# Altium footprint library MainLibrary.PcbLib: 85 footprints (part 4 of 6)
Each footprint in its own frame and in the unit in brackets; x right, y up, seen from the top. Pads: shape width x height; smd on the part's side, far side on the other; paste and mask are expansions set on the pad; w line width, h text height; cw(c..) or ccw(c..) is an arc to the next point about the centre after c.
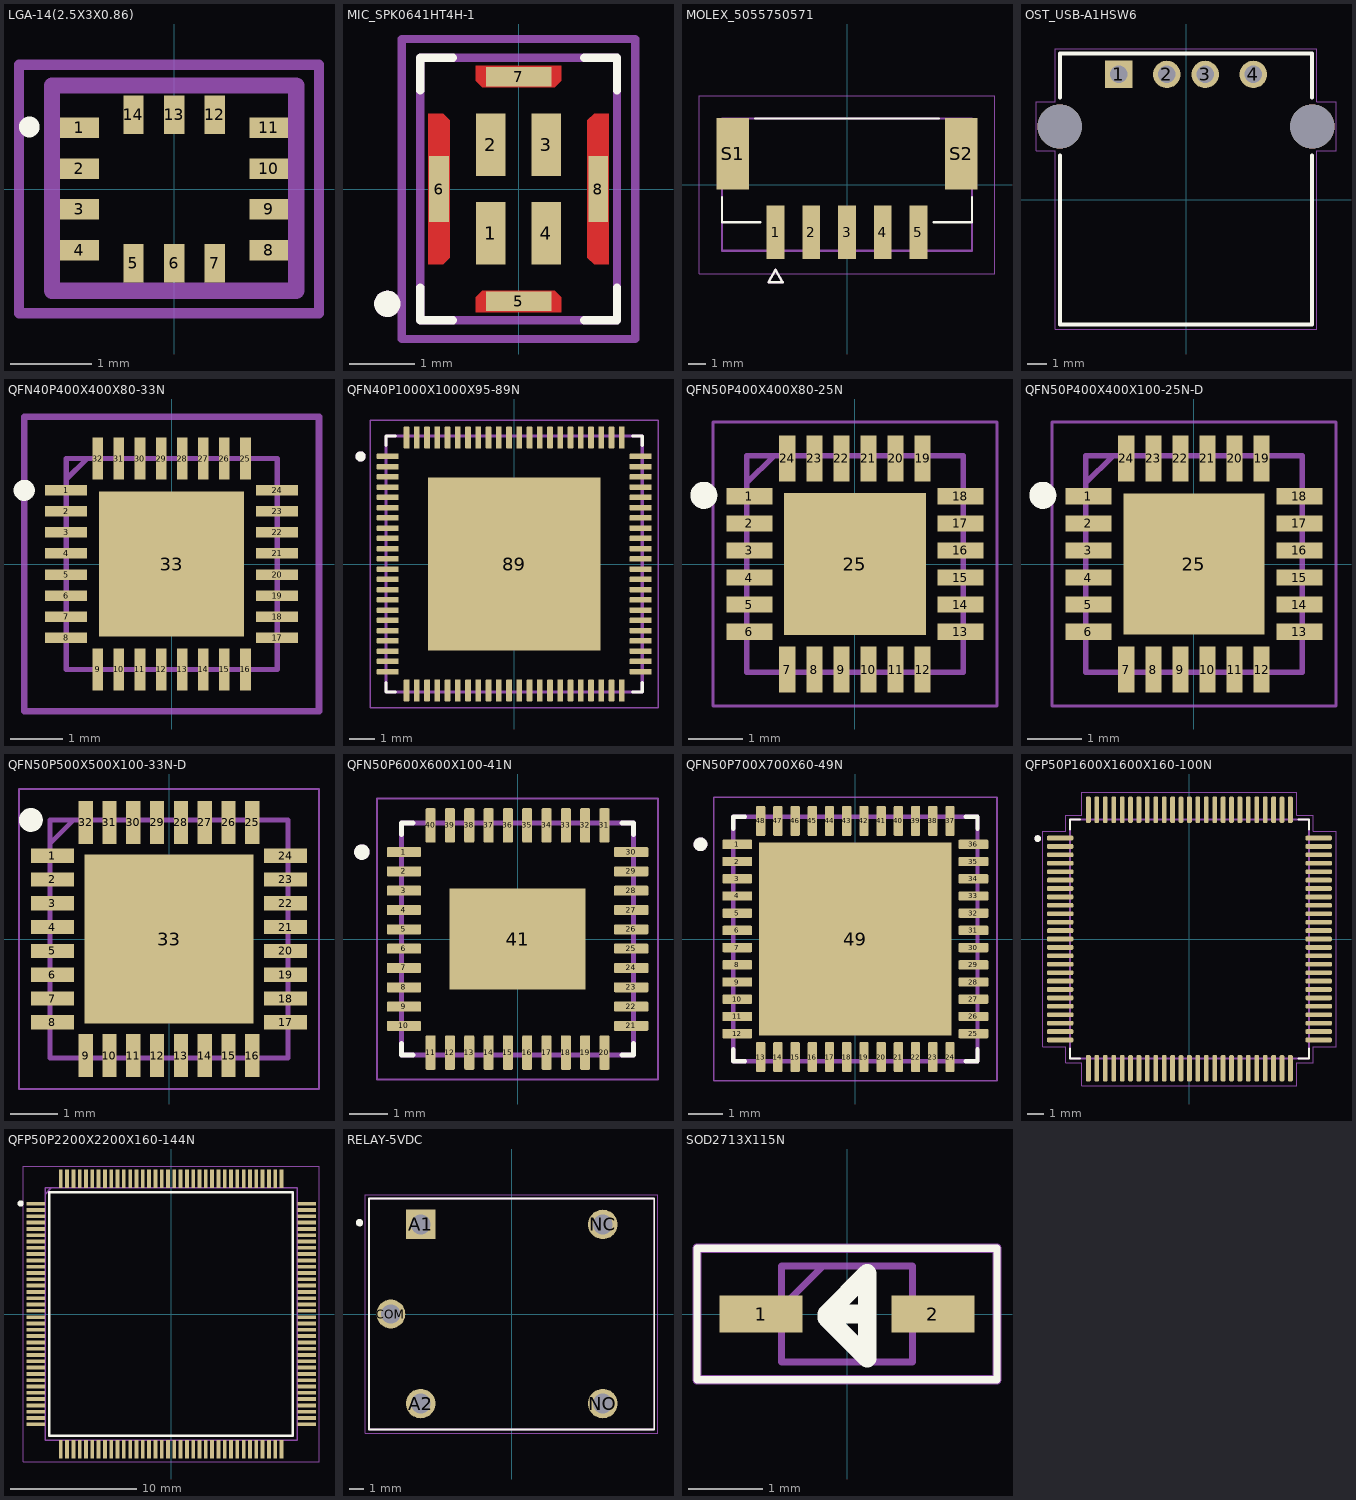
[diagram p3: the footprints below, top view; thin cyan lines are the x and y axes]

## LGA-14(2.5X3X0.86) [mm]
pads (14):
  rect 0.475x0.25 smd: 1(-1.162,0.75) 2(-1.162,0.25) 3(-1.162,-0.25) 4(-1.162,-0.75) 8(1.162,-0.75) 9(1.162,-0.25) 10(1.162,0.25) 11(1.162,0.75)
  rect 0.25x0.475 smd: 5(-0.5,-0.913) 6(0,-0.913) 7(0.5,-0.913) 12(0.5,0.913) 13(0,0.913) 14(-0.5,0.913)
Top Overlay:
  circle w0.2: c-1.778,0.762 r0.027
Mechanical 13:
  lines w0.2: -1.5,-1.25 -1.5,1.27 1.5,1.27 1.5,-1.25 -1.5,-1.25
Mechanical 15:
  lines w0.127: -1.905,-1.524 1.778,-1.524 1.778,1.524 -1.905,1.524 -1.905,-1.524
3D body "LSM6DSOTR.stp": height 0.86, standoff 0, extent -1.5,-1.25 1.5,1.25

## MIC_SPK0641HT4H-1 [mm]
height 1.1
pads (8):
  rect 0.45x0.95 smd mask+0.05: 1(-0.425,-0.675) 2(-0.425,0.675) 3(0.425,0.675) 4(0.425,-0.675)
  rect 1x0.3 smd paste-1 mask+0: 5(0,-1.713) 7(0,1.713)
  rect 0.3x1 smd paste-1 mask+0: 6(-1.212,0) 8(1.212,0)
Top Layer:
  region: -1.05,1.05 -1.05,-1.05 -1.15,-1.15 -1.375,-1.15 -1.375,1.15 -1.15,1.15
  region: 1.375,-1.15 1.15,-1.15 1.05,-1.05 1.05,1.05 1.15,1.15 1.375,1.15
  region: 0.65,1.65 0.55,1.55 -0.55,1.55 -0.65,1.65 -0.65,1.875 0.65,1.875
  region: 0.65,-1.65 0.65,-1.875 -0.65,-1.875 -0.65,-1.65 -0.55,-1.55 0.55,-1.55
Top Overlay:
  circle w0.2: c-2,-1.75 r0.1
  lines w0.127: -1.5,-1.5 -1.5,-2 -1,-2 ; -1.5,1.5 -1.5,2 -1,2 ; 1,-2 1.5,-2 1.5,-1.5 ; 1,2 1.5,2 1.5,1.5
Top Paste:
  region: -1.05,1.05 -1.05,-1.05 -1.15,-1.15 -1.375,-1.15 -1.375,1.15 -1.15,1.15
  region: 1.375,-1.15 1.15,-1.15 1.05,-1.05 1.05,1.05 1.15,1.15 1.375,1.15
  region: 0.65,1.65 0.55,1.55 -0.55,1.55 -0.65,1.65 -0.65,1.875 0.65,1.875
  region: 0.65,-1.65 0.65,-1.875 -0.65,-1.875 -0.65,-1.65 -0.55,-1.55 0.55,-1.55
Top Solder:
  region: -0.95,1.1 -0.95,-1.1 -1.1,-1.25 -1.475,-1.25 -1.475,1.25 -1.1,1.25
  region: 1.475,-1.25 1.1,-1.25 0.95,-1.1 0.95,1.1 1.1,1.25 1.475,1.25
  region: 0.75,1.6 0.6,1.45 -0.6,1.45 -0.75,1.6 -0.75,1.975 0.75,1.975
  region: 0.75,-1.6 0.75,-1.975 -0.75,-1.975 -0.75,-1.6 -0.6,-1.45 0.6,-1.45
Mechanical 13:
  circle w0.2: c-2,-1.75 r0.1
  lines w0.127: -1.5,-2 1.5,-2 1.5,2 -1.5,2 -1.5,-2
Mechanical 15:
  lines w0.127: -1.778,-2.286 1.778,-2.286 1.778,2.286 -1.778,2.286 -1.778,-2.286

## MOLEX_5055750571 [mm]
height 8.6
pads (7):
  rect 1x3 smd mask+0.076: 1(-4,-2.655) 2(-2,-2.655) 3(0,-2.655) 4(2,-2.655) 5(4,-2.655)
  rect 1.8x4 smd mask+0.076: S1(-6.4,1.745) S2(6.4,1.745)
Top Overlay:
  lines w0.127: -7,-0.695 -7,-2.095 -4.85,-2.095 ; -5.15,3.705 5.15,3.705 ; 4.85,-2.095 7,-2.095 7,-0.695 ; -4.4,-5.455 -4,-4.755 -3.6,-5.455 -4.4,-5.455
Mechanical 13:
  lines w0.127: -7,-3.705 -7,3.705 7,3.705 7,-3.705 -7,-3.705 ; -4.4,-5.455 -4,-4.755 -3.6,-5.455 -4.4,-5.455
Mechanical 15:
  lines w0.05: -8.27,-4.975 8.27,-4.975 8.27,4.975 -8.27,4.975 -8.27,-4.975
3D body "5055750571.stp": height 8.6, standoff 0, extent -7,-3.727 7,3.683

## OST_USB-A1HSW6 [mm]
pads (6):
  rect 1.428x1.428 / inner round 1.428 / far side rect 1.428x1.428 hole 0.92: 1(-3.5,6.51)
  round 1.428 hole 0.92: 2(-1,6.51) 3(1,6.51) 4(3.5,6.51)
  round 2.3 hole 2.3 unplated: ""(-6.57,3.8) ""(6.57,3.8)
Top Overlay:
  lines w0.2: -6.55,2.3 -6.55,-6.5 6.55,-6.5 6.55,2.3 ; -6.55,5.3 -6.55,7.6 6.55,7.6 6.55,5.3
Mechanical 15:
  lines w0.05: -7.8,2.55 -7.8,5.1 -6.8,5.1 -6.8,7.85 6.8,7.85 6.8,5.1 7.8,5.1 7.8,2.55 6.8,2.55 6.8,-6.75 -6.8,-6.75 -6.8,2.55 -7.8,2.55
3D body "step_temp.STEP": height 7.16, standoff -3.64, extent -7.9,-6.48 7.9,7.62

## PCBComponent_1 [mm]

## QFN40P400X400X80-33N [mm]
pads (33):
  rect 0.8x0.2 smd: 1(-2,1.4) 2(-2,1) 3(-2,0.6) 4(-2,0.2) 5(-2,-0.2) 6(-2,-0.6) 7(-2,-1) 8(-2,-1.4) 17(2,-1.4) 18(2,-1) 19(2,-0.6) 20(2,-0.2) 21(2,0.2) 22(2,0.6) 23(2,1) 24(2,1.4)
  rect 0.2x0.8 smd: 9(-1.4,-2) 10(-1,-2) 11(-0.6,-2) 12(-0.2,-2) 13(0.2,-2) 14(0.6,-2) 15(1,-2) 16(1.4,-2) 25(1.4,2) 26(1,2) 27(0.6,2) 28(0.2,2) 29(-0.2,2) 30(-0.6,2) 31(-1,2) 32(-1.4,2)
  rect 2.75x2.75 smd: 33(0,0)
Top Overlay:
  circle w0.2: c-2.794,1.397 r0.1
Mechanical 13:
  lines w0.1: -2,1.6 -1.6,2 ; -2,-2 2,-2 2,2 -2,2 -2,-2
Mechanical 15:
  lines w0.127: -2.794,-2.794 2.794,-2.794 2.794,2.794 -2.794,2.794 -2.794,-2.794
3D body "WM8904CGEFL_V.stp": height 0.8, standoff 0, extent -2.05,-2.05 2.05,2.05

## QFN40P1000X1000X95-89N [mm]
pads (89):
  rrect25% 0.86x0.22 smd: 1(-4.935,4.2) 2(-4.935,3.8) 3(-4.935,3.4) 4(-4.935,3) 5(-4.935,2.6) 6(-4.935,2.2) 7(-4.935,1.8) 8(-4.935,1.4) 9(-4.935,1) 10(-4.935,0.6) 11(-4.935,0.2) 12(-4.935,-0.2) 13(-4.935,-0.6) 14(-4.935,-1) 15(-4.935,-1.4) 16(-4.935,-1.8) 17(-4.935,-2.2) 18(-4.935,-2.6) 19(-4.935,-3) 20(-4.935,-3.4) 21(-4.935,-3.8) 22(-4.935,-4.2) 45(4.935,-4.2) 46(4.935,-3.8) 47(4.935,-3.4) 48(4.935,-3) 49(4.935,-2.6) 50(4.935,-2.2) 51(4.935,-1.8) 52(4.935,-1.4) 53(4.935,-1) 54(4.935,-0.6) 55(4.935,-0.2) 56(4.935,0.2) 57(4.935,0.6) 58(4.935,1) 59(4.935,1.4) 60(4.935,1.8) 61(4.935,2.2) 62(4.935,2.6) 63(4.935,3) 64(4.935,3.4) 65(4.935,3.8) 66(4.935,4.2)
  rrect25% 0.22x0.86 smd: 23(-4.2,-4.935) 24(-3.8,-4.935) 25(-3.4,-4.935) 26(-3,-4.935) 27(-2.6,-4.935) 28(-2.2,-4.935) 29(-1.8,-4.935) 30(-1.4,-4.935) 31(-1,-4.935) 32(-0.6,-4.935) 33(-0.2,-4.935) 34(0.2,-4.935) 35(0.6,-4.935) 36(1,-4.935) 37(1.4,-4.935) 38(1.8,-4.935) 39(2.2,-4.935) 40(2.6,-4.935) 41(3,-4.935) 42(3.4,-4.935) 43(3.8,-4.935) 44(4.2,-4.935) 67(4.2,4.935) 68(3.8,4.935) 69(3.4,4.935) 70(3,4.935) 71(2.6,4.935) 72(2.2,4.935) 73(1.8,4.935) 74(1.4,4.935) 75(1,4.935) 76(0.6,4.935) 77(0.2,4.935) 78(-0.2,4.935) 79(-0.6,4.935) 80(-1,4.935) 81(-1.4,4.935) 82(-1.8,4.935) 83(-2.2,4.935) 84(-2.6,4.935) 85(-3,4.935) 86(-3.4,4.935) 87(-3.8,4.935) 88(-4.2,4.935)
  rect 6.74x6.74 smd paste-2.66: 89(0,0)
Top Overlay:
  circle w0.2: c-5.995,4.2 r0.1
  lines w0.127: -5,-4.63 -5,-5 -4.63,-5 ; -5,4.63 -5,5 -4.63,5 ; 4.63,-5 5,-5 5,-4.63 ; 4.63,5 5,5 5,4.63
Top Paste:
  region: -1.54,1.54 -2.96,1.54 -2.96,2.96 -1.54,2.96
  region: 0.71,1.54 -0.71,1.54 -0.71,2.96 0.71,2.96
  region: 2.96,1.54 1.54,1.54 1.54,2.96 2.96,2.96
  region: -1.54,-0.71 -2.96,-0.71 -2.96,0.71 -1.54,0.71
  region: 2.96,-0.71 1.54,-0.71 1.54,0.71 2.96,0.71
  region: -1.54,-2.96 -2.96,-2.96 -2.96,-1.54 -1.54,-1.54
  region: 0.71,-2.96 -0.71,-2.96 -0.71,-1.54 0.71,-1.54
  region: 2.96,-2.96 1.54,-2.96 1.54,-1.54 2.96,-1.54
Mechanical 13:
  circle w0.2: c-5.995,4.2 r0.1
  lines w0.127: -5,-5 5,-5 5,5 -5,5 -5,-5
Mechanical 15:
  lines w0.05: -5.615,-5.615 5.615,-5.615 5.615,5.615 -5.615,5.615 -5.615,-5.615
3D body "--3DModel-STEP-56544.STEP": height 0.9, standoff 0, extent -5,-5 5,5

## QFN50P400X400X80-25N [mm]
pads (25):
  rect 0.85x0.3 smd: 1(-1.95,1.25) 2(-1.95,0.75) 3(-1.95,0.25) 4(-1.95,-0.25) 5(-1.95,-0.75) 6(-1.95,-1.25) 13(1.95,-1.25) 14(1.95,-0.75) 15(1.95,-0.25) 16(1.95,0.25) 17(1.95,0.75) 18(1.95,1.25)
  rect 0.3x0.85 smd: 7(-1.25,-1.95) 8(-0.75,-1.95) 9(-0.25,-1.95) 10(0.25,-1.95) 11(0.75,-1.95) 12(1.25,-1.95) 19(1.25,1.95) 20(0.75,1.95) 21(0.25,1.95) 22(-0.25,1.95) 23(-0.75,1.95) 24(-1.25,1.95)
  rect 2.63x2.63 smd: 25(0,0)
Top Overlay:
  circle w0.25: c-2.794,1.27 r0.125
Mechanical 13:
  lines w0.1: -2,1.5 -1.5,2 ; -2,-2 2,-2 2,2 -2,2 -2,-2
Mechanical 15:
  lines w0.05: -2.625,-2.625 2.625,-2.625 2.625,2.625 -2.625,2.625 -2.625,-2.625
3D body "MAX9860ETG+T.stp": height 0.8, standoff 0, extent -2.05,-2.05 2.05,2.05

## QFN50P400X400X100-25N-D [mm]
pads (25):
  rect 0.85x0.3 smd: 1(-1.95,1.25) 2(-1.95,0.75) 3(-1.95,0.25) 4(-1.95,-0.25) 5(-1.95,-0.75) 6(-1.95,-1.25) 13(1.95,-1.25) 14(1.95,-0.75) 15(1.95,-0.25) 16(1.95,0.25) 17(1.95,0.75) 18(1.95,1.25)
  rect 0.3x0.85 smd: 7(-1.25,-1.95) 8(-0.75,-1.95) 9(-0.25,-1.95) 10(0.25,-1.95) 11(0.75,-1.95) 12(1.25,-1.95) 19(1.25,1.95) 20(0.75,1.95) 21(0.25,1.95) 22(-0.25,1.95) 23(-0.75,1.95) 24(-1.25,1.95)
  rect 2.6x2.6 smd: 25(0,0)
Top Overlay:
  circle w0.25: c-2.794,1.27 r0.125
Mechanical 13:
  lines w0.1: -2,1.5 -1.5,2 ; -2,-2 -2,2 2,2 2,-2 -2,-2
Mechanical 15:
  lines w0.05: -2.625,-2.625 -2.625,2.625 2.625,2.625 2.625,-2.625 -2.625,-2.625
3D body "LAN8720A-CP-TR.stp": height 1, standoff 0, extent -2.05,-2.05 2.05,2.05

## QFN50P500X500X100-33N-D [mm]
pads (33):
  rect 0.9x0.3 smd: 1(-2.45,1.75) 2(-2.45,1.25) 3(-2.45,0.75) 4(-2.45,0.25) 5(-2.45,-0.25) 6(-2.45,-0.75) 7(-2.45,-1.25) 8(-2.45,-1.75) 17(2.45,-1.75) 18(2.45,-1.25) 19(2.45,-0.75) 20(2.45,-0.25) 21(2.45,0.25) 22(2.45,0.75) 23(2.45,1.25) 24(2.45,1.75)
  rect 0.3x0.9 smd: 9(-1.75,-2.45) 10(-1.25,-2.45) 11(-0.75,-2.45) 12(-0.25,-2.45) 13(0.25,-2.45) 14(0.75,-2.45) 15(1.25,-2.45) 16(1.75,-2.45) 25(1.75,2.45) 26(1.25,2.45) 27(0.75,2.45) 28(0.25,2.45) 29(-0.25,2.45) 30(-0.75,2.45) 31(-1.25,2.45) 32(-1.75,2.45)
  rect 3.55x3.55 smd: 33(0,0)
Top Overlay:
  circle w0.25: c-2.9,2.5 r0.125
Mechanical 13:
  lines w0.1: -2.5,2 -2,2.5 ; -2.5,-2.5 2.5,-2.5 2.5,2.5 -2.5,2.5 -2.5,-2.5
Mechanical 15:
  lines w0.05: -3.15,-3.15 3.15,-3.15 3.15,3.15 -3.15,3.15 -3.15,-3.15
3D body "TPS65263RHBR.STEP": height 1, standoff 0, extent -2.5,-2.5 2.5,2.5

## QFN50P600X600X100-41N [mm]
pads (41):
  rrect25% 0.89x0.26 smd: 1(-2.94,2.25) 2(-2.94,1.75) 3(-2.94,1.25) 4(-2.94,0.75) 5(-2.94,0.25) 6(-2.94,-0.25) 7(-2.94,-0.75) 8(-2.94,-1.25) 9(-2.94,-1.75) 10(-2.94,-2.25) 21(2.94,-2.25) 22(2.94,-1.75) 23(2.94,-1.25) 24(2.94,-0.75) 25(2.94,-0.25) 26(2.94,0.25) 27(2.94,0.75) 28(2.94,1.25) 29(2.94,1.75) 30(2.94,2.25)
  rrect25% 0.26x0.89 smd: 11(-2.25,-2.94) 12(-1.75,-2.94) 13(-1.25,-2.94) 14(-0.75,-2.94) 15(-0.25,-2.94) 16(0.25,-2.94) 17(0.75,-2.94) 18(1.25,-2.94) 19(1.75,-2.94) 20(2.25,-2.94) 31(2.25,2.94) 32(1.75,2.94) 33(1.25,2.94) 34(0.75,2.94) 35(0.25,2.94) 36(-0.25,2.94) 37(-0.75,2.94) 38(-1.25,2.94) 39(-1.75,2.94) 40(-2.25,2.94)
  rect 3.52x2.62 smd paste-3: 41(0,0)
Top Overlay:
  circle w0.2: c-4.03,2.25 r0.1
  lines w0.127: -3,-2.7 -3,-3 -2.7,-3 ; -3,2.7 -3,3 -2.7,3 ; 2.7,-3 3,-3 3,-2.7 ; 2.7,3 3,3 3,2.7
Top Paste:
  region: 1.11,-0.83 -1.11,-0.83 -1.11,0.83 1.11,0.83
Mechanical 13:
  circle w0.2: c-4.03,2.25 r0.1
  lines w0.127: -3,-3 3,-3 3,3 -3,3 -3,-3
Mechanical 15:
  lines w0.05: -3.635,-3.635 3.635,-3.635 3.635,3.635 -3.635,3.635 -3.635,-3.635
3D body "step_temp.STEP": height 1, standoff 0, extent -3,-3 3,3

## QFN50P700X700X60-49N [mm]
pads (49):
  rrect25% 0.87x0.27 smd: 1(-3.43,2.75) 2(-3.43,2.25) 3(-3.43,1.75) 4(-3.43,1.25) 5(-3.43,0.75) 6(-3.43,0.25) 7(-3.43,-0.25) 8(-3.43,-0.75) 9(-3.43,-1.25) 10(-3.43,-1.75) 11(-3.43,-2.25) 12(-3.43,-2.75) 25(3.43,-2.75) 26(3.43,-2.25) 27(3.43,-1.75) 28(3.43,-1.25) 29(3.43,-0.75) 30(3.43,-0.25) 31(3.43,0.25) 32(3.43,0.75) 33(3.43,1.25) 34(3.43,1.75) 35(3.43,2.25) 36(3.43,2.75)
  rrect25% 0.27x0.87 smd: 13(-2.75,-3.43) 14(-2.25,-3.43) 15(-1.75,-3.43) 16(-1.25,-3.43) 17(-0.75,-3.43) 18(-0.25,-3.43) 19(0.25,-3.43) 20(0.75,-3.43) 21(1.25,-3.43) 22(1.75,-3.43) 23(2.25,-3.43) 24(2.75,-3.43) 37(2.75,3.43) 38(2.25,3.43) 39(1.75,3.43) 40(1.25,3.43) 41(0.75,3.43) 42(0.25,3.43) 43(-0.25,3.43) 44(-0.75,3.43) 45(-1.25,3.43) 46(-1.75,3.43) 47(-2.25,3.43) 48(-2.75,3.43)
  rect 5.6x5.6 smd paste-4: 49(0,0)
Top Overlay:
  circle w0.2: c-4.5,2.75 r0.1
  lines w0.127: -3.55,-3.205 -3.55,-3.55 -3.205,-3.55 ; -3.55,3.205 -3.55,3.55 -3.205,3.55 ; 3.205,-3.55 3.55,-3.55 3.55,-3.205 ; 3.205,3.55 3.55,3.55 3.55,3.205
Top Paste:
  region: 2.29,-2.29 0.51,-2.29 0.51,-0.51 2.29,-0.51
  region: -0.51,-2.29 -2.29,-2.29 -2.29,-0.51 -0.51,-0.51
  region: 2.29,0.51 0.51,0.51 0.51,2.29 2.29,2.29
  region: -0.51,0.51 -2.29,0.51 -2.29,2.29 -0.51,2.29
Mechanical 13:
  circle w0.2: c-4.5,2.75 r0.1
  lines w0.127: -3.55,-3.55 -3.55,3.55 3.55,3.55 3.55,-3.55 -3.55,-3.55
Mechanical 15:
  lines w0.05: -4.115,-4.115 -4.115,4.115 4.115,4.115 4.115,-4.115 -4.115,-4.115
3D body "step_temp.STEP": height 0.6, standoff 0, extent -3.5,-3.5 3.5,3.5

## QFP50P1600X1600X160-100N [mm]
pads (100):
  rrect50% 1.56x0.28 smd: 1(-7.68,6) 2(-7.68,5.5) 3(-7.68,5) 4(-7.68,4.5) 5(-7.68,4) 6(-7.68,3.5) 7(-7.68,3) 8(-7.68,2.5) 9(-7.68,2) 10(-7.68,1.5) 11(-7.68,1) 12(-7.68,0.5) 13(-7.68,0) 14(-7.68,-0.5) 15(-7.68,-1) 16(-7.68,-1.5) 17(-7.68,-2) 18(-7.68,-2.5) 19(-7.68,-3) 20(-7.68,-3.5) 21(-7.68,-4) 22(-7.68,-4.5) 23(-7.68,-5) 24(-7.68,-5.5) 25(-7.68,-6) 51(7.68,-6) 52(7.68,-5.5) 53(7.68,-5) 54(7.68,-4.5) 55(7.68,-4) 56(7.68,-3.5) 57(7.68,-3) 58(7.68,-2.5) 59(7.68,-2) 60(7.68,-1.5) 61(7.68,-1) 62(7.68,-0.5) 63(7.68,0) 64(7.68,0.5) 65(7.68,1) 66(7.68,1.5) 67(7.68,2) 68(7.68,2.5) 69(7.68,3) 70(7.68,3.5) 71(7.68,4) 72(7.68,4.5) 73(7.68,5) 74(7.68,5.5) 75(7.68,6)
  rrect50% 0.28x1.56 smd: 26(-6,-7.68) 27(-5.5,-7.68) 28(-5,-7.68) 29(-4.5,-7.68) 30(-4,-7.68) 31(-3.5,-7.68) 32(-3,-7.68) 33(-2.5,-7.68) 34(-2,-7.68) 35(-1.5,-7.68) 36(-1,-7.68) 37(-0.5,-7.68) 38(0,-7.68) 39(0.5,-7.68) 40(1,-7.68) 41(1.5,-7.68) 42(2,-7.68) 43(2.5,-7.68) 44(3,-7.68) 45(3.5,-7.68) 46(4,-7.68) 47(4.5,-7.68) 48(5,-7.68) 49(5.5,-7.68) 50(6,-7.68) 76(6,7.68) 77(5.5,7.68) 78(5,7.68) 79(4.5,7.68) 80(4,7.68) 81(3.5,7.68) 82(3,7.68) 83(2.5,7.68) 84(2,7.68) 85(1.5,7.68) 86(1,7.68) 87(0.5,7.68) 88(0,7.68) 89(-0.5,7.68) 90(-1,7.68) 91(-1.5,7.68) 92(-2,7.68) 93(-2.5,7.68) 94(-3,7.68) 95(-3.5,7.68) 96(-4,7.68) 97(-4.5,7.68) 98(-5,7.68) 99(-5.5,7.68) 100(-6,7.68)
Top Overlay:
  circle w0.2: c-9.017,5.969 r0.1
  lines w0.127: -7.1,-6.5 -7.1,-7.1 -6.5,-7.1 ; -7.1,6.5 -7.1,7.1 -6.5,7.1 ; 6.5,-7.1 7.1,-7.1 7.1,-6.5 ; 6.5,7.1 7.1,7.1 7.1,6.5
Mechanical 13:
  circle w0.2: c-9.017,5.969 r0.1
  lines w0.127: -7.1,-7.1 7.1,-7.1 7.1,7.1 -7.1,7.1 -7.1,-7.1
Mechanical 15:
  lines w0.05: -8.71,-6.39 -7.35,-6.39 -7.35,-7.35 -6.39,-7.35 -6.39,-8.71 6.39,-8.71 6.39,-7.35 7.35,-7.35 7.35,-6.39 8.71,-6.39 8.71,6.39 7.35,6.39 7.35,7.35 6.39,7.35 6.39,8.71 -6.39,8.71 -6.39,7.35 -7.35,7.35 -7.35,6.39 -8.71,6.39 -8.71,-6.39
3D body "STM32F407VGT6.STEP": height 1.59, standoff -0.01, extent -8,-8 8,8

## QFP50P2200X2200X160-144N [mm]
pads (144):
  rect 1.475x0.3 smd: 1(-10.738,8.75) 2(-10.738,8.25) 3(-10.738,7.75) 4(-10.738,7.25) 5(-10.738,6.75) 6(-10.738,6.25) 7(-10.738,5.75) 8(-10.738,5.25) 9(-10.738,4.75) 10(-10.738,4.25) 11(-10.738,3.75) 12(-10.738,3.25) 13(-10.738,2.75) 14(-10.738,2.25) 15(-10.738,1.75) 16(-10.738,1.25) 17(-10.738,0.75) 18(-10.738,0.25) 19(-10.738,-0.25) 20(-10.738,-0.75) 21(-10.738,-1.25) 22(-10.738,-1.75) 23(-10.738,-2.25) 24(-10.738,-2.75) 25(-10.738,-3.25) 26(-10.738,-3.75) 27(-10.738,-4.25) 28(-10.738,-4.75) 29(-10.738,-5.25) 30(-10.738,-5.75) 31(-10.738,-6.25) 32(-10.738,-6.75) 33(-10.738,-7.25) 34(-10.738,-7.75) 35(-10.738,-8.25) 36(-10.738,-8.75) 73(10.738,-8.75) 74(10.738,-8.25) 75(10.738,-7.75) 76(10.738,-7.25) 77(10.738,-6.75) 78(10.738,-6.25) 79(10.738,-5.75) 80(10.738,-5.25) 81(10.738,-4.75) 82(10.738,-4.25) 83(10.738,-3.75) 84(10.738,-3.25) 85(10.738,-2.75) 86(10.738,-2.25) 87(10.738,-1.75) 88(10.738,-1.25) 89(10.738,-0.75) 90(10.738,-0.25) 91(10.738,0.25) 92(10.738,0.75) 93(10.738,1.25) 94(10.738,1.75) 95(10.738,2.25) 96(10.738,2.75) 97(10.738,3.25) 98(10.738,3.75) 99(10.738,4.25) 100(10.738,4.75) 101(10.738,5.25) 102(10.738,5.75) 103(10.738,6.25) 104(10.738,6.75) 105(10.738,7.25) 106(10.738,7.75) 107(10.738,8.25) 108(10.738,8.75)
  rect 0.3x1.475 smd: 37(-8.75,-10.738) 38(-8.25,-10.738) 39(-7.75,-10.738) 40(-7.25,-10.738) 41(-6.75,-10.738) 42(-6.25,-10.738) 43(-5.75,-10.738) 44(-5.25,-10.738) 45(-4.75,-10.738) 46(-4.25,-10.738) 47(-3.75,-10.738) 48(-3.25,-10.738) 49(-2.75,-10.738) 50(-2.25,-10.738) 51(-1.75,-10.738) 52(-1.25,-10.738) 53(-0.75,-10.738) 54(-0.25,-10.738) 55(0.25,-10.738) 56(0.75,-10.738) 57(1.25,-10.738) 58(1.75,-10.738) 59(2.25,-10.738) 60(2.75,-10.738) 61(3.25,-10.738) 62(3.75,-10.738) 63(4.25,-10.738) 64(4.75,-10.738) 65(5.25,-10.738) 66(5.75,-10.738) 67(6.25,-10.738) 68(6.75,-10.738) 69(7.25,-10.738) 70(7.75,-10.738) 71(8.25,-10.738) 72(8.75,-10.738) 109(8.75,10.738) 110(8.25,10.738) 111(7.75,10.738) 112(7.25,10.738) 113(6.75,10.738) 114(6.25,10.738) 115(5.75,10.738) 116(5.25,10.738) 117(4.75,10.738) 118(4.25,10.738) 119(3.75,10.738) 120(3.25,10.738) 121(2.75,10.738) 122(2.25,10.738) 123(1.75,10.738) 124(1.25,10.738) 125(0.75,10.738) 126(0.25,10.738) 127(-0.25,10.738) 128(-0.75,10.738) 129(-1.25,10.738) 130(-1.75,10.738) 131(-2.25,10.738) 132(-2.75,10.738) 133(-3.25,10.738) 134(-3.75,10.738) 135(-4.25,10.738) 136(-4.75,10.738) 137(-5.25,10.738) 138(-5.75,10.738) 139(-6.25,10.738) 140(-6.75,10.738) 141(-7.25,10.738) 142(-7.75,10.738) 143(-8.25,10.738) 144(-8.75,10.738)
Top Overlay:
  circle w0.25: c-11.938,8.763 r0.125
  lines w0.2: -9.65,-9.65 -9.65,9.65 9.65,9.65 9.65,-9.65 -9.65,-9.65
Mechanical 13:
  lines w0.1: -10,9.5 -9.5,10 ; -10,-10 -10,10 10,10 10,-10 -10,-10
Mechanical 15:
  lines w0.05: -11.725,-11.725 -11.725,11.725 11.725,11.725 11.725,-11.725 -11.725,-11.725
3D body "STM32H745ZIT6.stp": height 1.6, standoff 0, extent -11,-11 11,11

## RELAY-5VDC [mm]
pads (5):
  rect 1.98x1.98 / inner round 1.98 / far side rect 1.98x1.98 hole 1.32: A1(-6.1,6)
  round 1.98 hole 1.32: A2(-6.1,-6) NC(6.1,6) NO(6.1,-6)
  round 1.935 hole 1.29: COM(-8.1,0)
Top Overlay:
  circle w0.3: c-10.2,6.119 r0.1
  lines w0.127: -9.55,-7.75 -9.55,7.75 9.55,7.75 9.55,-7.75 -9.55,-7.75
Mechanical 13:
  lines w0.127: -9.55,-7.75 -9.55,7.75 9.55,7.75 9.55,-7.75 -9.55,-7.75
Mechanical 15:
  lines w0.05: -9.8,-8 -9.8,8 9.8,8 9.8,-8 -9.8,-8
3D body "step_temp.STEP": height 15.8, standoff -3, extent -9.6,-7.8 9.6,7.8

## SOD2713X115N [mm]
pads (2):
  rect 1.125x0.5 smd: 1(-1.162,0) 2(1.162,0)
Top Overlay:
  lines w0.1: -2.032,-0.889 -2.032,0.889 2.032,0.889 2.032,-0.889 -2.032,-0.889
  lines w0.254: -0.275,-0.05 0.275,-0.6 0.275,0.55 -0.275,0 0.275,0
Mechanical 13:
  lines w0.1: -0.888,0.088 -0.325,0.65 ; -0.888,-0.65 0.888,-0.65 0.888,0.65 -0.888,0.65 -0.888,-0.65
Mechanical 15:
  lines w0.127: -2.032,-0.889 2.032,-0.889 2.032,0.889 -2.032,0.889 -2.032,-0.889
3D body "1N4148WS-E3-08.stp": height 1.15, standoff 0, extent -1.338,-0.65 1.338,0.65